# Altium footprint library Electronic Devices_LIB.PcbLib: 410 footprints (part 17 of 26)
Each footprint in its own frame and in the unit in brackets; x right, y up, seen from the top. Pads: shape width x height; smd on the part's side, far side on the other; paste and mask are expansions set on the pad; w line width, h text height; cw(c..) or ccw(c..) is an arc to the next point about the centre after c.
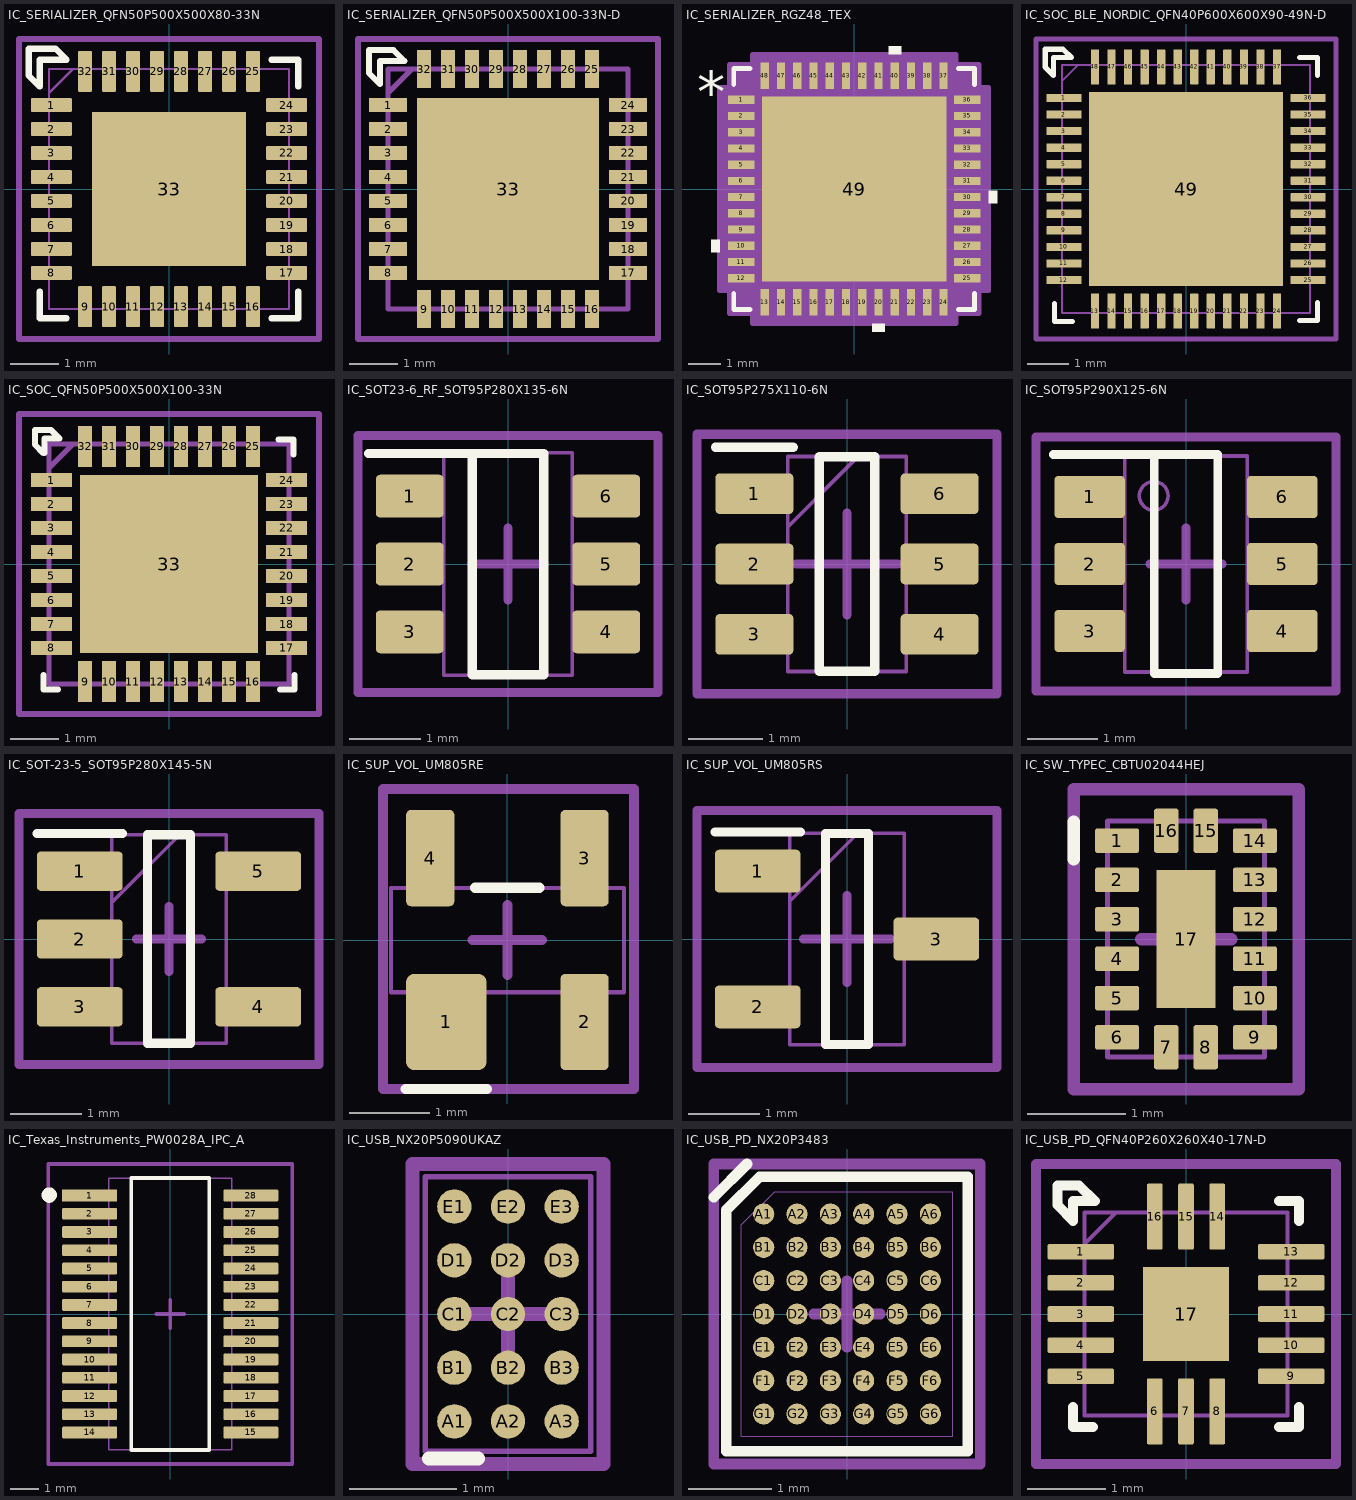
[diagram p16: the footprints below, top view; thin cyan lines are the x and y axes]

## IC_SERIALIZER_QFN50P500X500X80-33N [mm]
pads (33):
  rrect20% 0.85x0.3 smd paste+0 mask+0.076: 1(-2.45,1.75) 2(-2.45,1.25) 3(-2.45,0.75) 4(-2.45,0.25) 5(-2.45,-0.25) 6(-2.45,-0.75) 7(-2.45,-1.25) 8(-2.45,-1.75) 17(2.45,-1.75) 18(2.45,-1.25) 19(2.45,-0.75) 20(2.45,-0.25) 21(2.45,0.25) 22(2.45,0.75) 23(2.45,1.25) 24(2.45,1.75)
  rrect20% 0.3x0.85 smd paste+0 mask+0.076: 9(-1.75,-2.45) 10(-1.25,-2.45) 11(-0.75,-2.45) 12(-0.25,-2.45) 13(0.25,-2.45) 14(0.75,-2.45) 15(1.25,-2.45) 16(1.75,-2.45) 25(1.75,2.45) 26(1.25,2.45) 27(0.75,2.45) 28(0.25,2.45) 29(-0.25,2.45) 30(-0.75,2.45) 31(-1.25,2.45) 32(-1.75,2.45)
  rect 3.2x3.2 smd: 33(0,0)
Top Overlay:
  lines w0.127: -2.692,-2.134 -2.692,-2.692 -2.134,-2.692 ; 2.134,-2.692 2.692,-2.692 2.692,-2.134 ; 2.134,2.692 2.692,2.692 2.692,2.134 ; -2.921,2.362 -2.921,2.921 -2.362,2.921 -2.134,2.692 -2.692,2.692 -2.692,2.134 -2.921,2.362
Top Assembly:
  lines w0.051: -2.5,2 -2,2.5 ; -2.5,-2.5 -2.5,2.5 2.5,2.5 2.5,-2.5 -2.5,-2.5
  text ".Designator" at -2.438,-0.11 h0.51
Top Courtyard:
  lines w0.127: -0.787,0 0,0 ; 0,-0.787 0,0 ; 0,0.787 0,0 ; 0.787,0 0,0 ; -3.125,-3.125 -3.125,3.125 3.125,3.125 3.125,-3.125 -3.125,-3.125
3D body "DS90UB913ATRTVTQ1.stp": height 0.8, standoff 0, extent -2.55,-2.55 2.55,2.55

## IC_SERIALIZER_QFN50P500X500X100-33N-D [mm]
pads (33):
  rrect20% 0.8x0.3 smd: 1(-2.5,1.75) 2(-2.5,1.25) 3(-2.5,0.75) 4(-2.5,0.25) 5(-2.5,-0.25) 6(-2.5,-0.75) 7(-2.5,-1.25) 8(-2.5,-1.75) 17(2.5,-1.75) 18(2.5,-1.25) 19(2.5,-0.75) 20(2.5,-0.25) 21(2.5,0.25) 22(2.5,0.75) 23(2.5,1.25) 24(2.5,1.75)
  rrect20% 0.3x0.8 smd: 9(-1.75,-2.5) 10(-1.25,-2.5) 11(-0.75,-2.5) 12(-0.25,-2.5) 13(0.25,-2.5) 14(0.75,-2.5) 15(1.25,-2.5) 16(1.75,-2.5) 25(1.75,2.5) 26(1.25,2.5) 27(0.75,2.5) 28(0.25,2.5) 29(-0.25,2.5) 30(-0.75,2.5) 31(-1.25,2.5) 32(-1.75,2.5)
  rect 3.8x3.8 smd: 33(0,0)
Top Overlay:
  lines w0.127: -2.896,2.413 -2.896,2.896 -2.388,2.896 -2.159,2.667 -2.667,2.667 -2.667,2.184 -2.896,2.413
Top Assembly:
  text ".Designator" at -2.54,-0.161 h0.51
Top Courtyard:
  lines w0.127: -0.838,0 0,0 ; 0,-0.838 0,0 ; 0,0.838 0,0 ; 0.838,0 0,0 ; -3.125,-3.125 -3.125,3.125 3.125,3.125 3.125,-3.125 -3.125,-3.125
Top 3D Body:
  lines w0.1: -2.5,2 -2,2.5 ; -2.5,-2.5 -2.5,2.5 2.5,2.5 2.5,-2.5 -2.5,-2.5
3D body "DS90UB953ATRHBTQ1.stp": height 1, standoff 0, extent -2.5,-2.5 2.5,2.5

## IC_SERIALIZER_RGZ48_TEX [mil]
pads (49):
  rect 32x10 smd paste+0 mask+0: 1(-137,108.27) 2(-137,88.58) 3(-137,68.9) 4(-137,49.21) 5(-137,29.53) 6(-137,9.84) 7(-137,-9.84) 8(-137,-29.53) 9(-137,-49.21) 10(-137,-68.9) 11(-137,-88.58) 12(-137,-108.27) 25(137,-108.27) 26(137,-88.58) 27(137,-68.9) 28(137,-49.21) 29(137,-29.53) 30(137,-9.84) 31(137,9.84) 32(137,29.53) 33(137,49.21) 34(137,68.9) 35(137,88.58) 36(137,108.27)
  rect 10x32 smd paste+0 mask+0: 13(-108.27,-137) 14(-88.58,-137) 15(-68.9,-137) 16(-49.21,-137) 17(-29.53,-137) 18(-9.84,-137) 19(9.84,-137) 20(29.53,-137) 21(49.21,-137) 22(68.9,-137) 23(88.58,-137) 24(108.27,-137) 37(108.27,137) 38(88.58,137) 39(68.9,137) 40(49.21,137) 41(29.53,137) 42(9.84,137) 43(-9.84,137) 44(-29.53,137) 45(-49.21,137) 46(-68.9,137) 47(-88.58,137) 48(-108.27,137)
  rect 224x224 smd paste-111.5 mask-111.5: 49(0,0)
Top Overlay:
  region: 56.71,163 41.71,163 41.71,173 56.71,173
  region: 163,-2.34 173,-2.34 173,-17.34 163,-17.34
  region: 37.03,-163 22.03,-163 22.03,-173 37.03,-173
  region: -163,-61.4 -173,-61.4 -173,-76.4 -163,-76.4
  lines w6: -146,-126.37 -146,-146 -126.37,-146 ; -146,126.37 -146,146 -126.37,146 ; 126.37,-146 146,-146 146,-126.37 ; 126.37,146 146,146 146,126.37
  text "*" at -190.5,93.11 h50
Top Paste:
  drawing of 64 lines, arcs and shapes, not listed
Top Solder:
  region: 100.87,-114.5 100.87,114.5 114.5,114.5 114.5,-114.5
  region: 85.13,-114.5 85.13,114.5 69.87,114.5 69.87,-114.5
  region: 54.13,-114.5 54.13,114.5 38.87,114.5 38.87,-114.5
  region: 23.13,-114.5 23.13,114.5 7.87,114.5 7.87,-114.5
  region: -7.87,-114.5 -7.87,114.5 -23.13,114.5 -23.13,-114.5
  region: -38.87,-114.5 -38.87,114.5 -54.13,114.5 -54.13,-114.5
  region: -69.87,-114.5 -69.87,114.5 -85.13,114.5 -85.13,-114.5
  region: -114.5,-114.5 -114.5,114.5 -100.87,114.5 -100.87,-114.5
  region: -114.5,-114.5 -114.5,-100.87 114.5,-100.87 114.5,-114.5
  region: -114.5,-85.13 -114.5,-69.87 114.5,-69.87 114.5,-85.13
  region: -114.5,-54.13 -114.5,-38.87 114.5,-38.87 114.5,-54.13
  region: -114.5,-23.13 -114.5,-7.87 114.5,-7.87 114.5,-23.13
  region: -114.5,7.87 -114.5,23.13 114.5,23.13 114.5,7.87
  region: -114.5,38.87 -114.5,54.13 114.5,54.13 114.5,38.87
  region: -114.5,69.87 -114.5,85.13 114.5,85.13 114.5,69.87
  region: -114.5,100.87 -114.5,114.5 114.5,114.5 114.5,100.87
Top 3D Body:
  lines w1: -141,91 -91,141 ; -141,-141 -141,141 141,141 141,-141 -141,-141 ; -141,-114.27 -141,-102.27 -141,-114.27 ; -141,-94.58 -141,-82.58 -141,-94.58 ; -141,-74.9 -141,-62.9 -141,-74.9 ; -141,-55.21 -141,-43.21 -141,-55.21 ; -141,-35.53 -141,-23.53 -141,-35.53 ; -141,-15.84 -141,-3.84 -141,-15.84 ; -141,3.84 -141,15.84 -141,3.84 ; -141,23.53 -141,35.53 -141,23.53 ; -141,43.21 -141,55.21 -141,43.21 ; -141,62.9 -141,74.9 -141,62.9 ; -141,82.58 -141,94.58 -141,82.58 ; -141,102.27 -141,114.27 -141,102.27 ; -114.27,-141 -102.27,-141 -114.27,-141 ; -114.27,141 -102.27,141 -114.27,141 ; -94.58,-141 -82.58,-141 -94.58,-141 ; -94.58,141 -82.58,141 -94.58,141 ; -74.9,-141 -62.9,-141 -74.9,-141 ; -74.9,141 -62.9,141 -74.9,141 ; -55.21,-141 -43.21,-141 -55.21,-141 ; -55.21,141 -43.21,141 -55.21,141 ; -35.53,-141 -23.53,-141 -35.53,-141 ; -35.53,141 -23.53,141 -35.53,141 ; -15.84,-141 -3.84,-141 -15.84,-141 ; -15.84,141 -3.84,141 -15.84,141 ; 3.84,-141 15.84,-141 3.84,-141 ; 3.84,141 15.84,141 3.84,141 ; 23.53,-141 35.53,-141 23.53,-141 ; 23.53,141 35.53,141 23.53,141 ; 43.21,-141 55.21,-141 43.21,-141 ; 43.21,141 55.21,141 43.21,141 ; 62.9,-141 74.9,-141 62.9,-141 ; 62.9,141 74.9,141 62.9,141 ; 82.58,-141 94.58,-141 82.58,-141 ; 82.58,141 94.58,141 82.58,141 ; 102.27,-141 114.27,-141 102.27,-141 ; 102.27,141 114.27,141 102.27,141 ; 141,-114.27 141,-102.27 141,-114.27 ; 141,-94.58 141,-82.58 141,-94.58 ; 141,-74.9 141,-62.9 141,-74.9 ; 141,-55.21 141,-43.21 141,-55.21 ; 141,-35.53 141,-23.53 141,-35.53 ; 141,-15.84 141,-3.84 141,-15.84 ; 141,3.84 141,15.84 141,3.84 ; 141,23.53 141,35.53 141,23.53 ; 141,43.21 141,55.21 141,43.21 ; 141,62.9 141,74.9 141,62.9 ; 141,82.58 141,94.58 141,82.58 ; 141,102.27 141,114.27 141,102.27
  text "*" at -133.5,93.11 h50
Mechanical 15:
  region: -123.27,-151 -151,-151 -151,-123.27 -163,-123.27 -163,123.27 -151,123.27 -151,151 -123.27,151 -123.27,163 123.27,163 123.27,151 151,151 151,123.27 163,123.27 163,-123.27 151,-123.27 151,-151 123.27,-151 123.27,-163 -123.27,-163
  lines w6: -163,-123.27 -163,123.27 -151,123.27 -151,151 -123.27,151 -123.27,163 123.27,163 123.27,151 151,151 151,123.27 163,123.27 163,-123.27 151,-123.27 151,-151 123.27,-151 123.27,-163 -123.27,-163 -123.27,-151 -151,-151 -151,-123.27 -163,-123.27
3D body "RGZ48_TEX.step": height 39.09, standoff 0, extent -140.98,-140.98 140.98,140.98

## IC_SOC_BLE_NORDIC_QFN40P600X600X90-49N-D [mm] "48-VFQFN, EXPOSED PAD, PITCH 0.4mm"
height 0.9
pads (49):
  rrect20% 0.85x0.2 smd mask+0.076: 1(-2.95,2.2) 2(-2.95,1.8) 3(-2.95,1.4) 4(-2.95,1) 5(-2.95,0.6) 6(-2.95,0.2) 7(-2.95,-0.2) 8(-2.95,-0.6) 9(-2.95,-1) 10(-2.95,-1.4) 11(-2.95,-1.8) 12(-2.95,-2.2) 25(2.95,-2.2) 26(2.95,-1.8) 27(2.95,-1.4) 28(2.95,-1) 29(2.95,-0.6) 30(2.95,-0.2) 31(2.95,0.2) 32(2.95,0.6) 33(2.95,1) 34(2.95,1.4) 35(2.95,1.8) 36(2.95,2.2)
  rrect20% 0.2x0.85 smd mask+0.076: 13(-2.2,-2.95) 14(-1.8,-2.95) 15(-1.4,-2.95) 16(-1,-2.95) 17(-0.6,-2.95) 18(-0.2,-2.95) 19(0.2,-2.95) 20(0.6,-2.95) 21(1,-2.95) 22(1.4,-2.95) 23(1.8,-2.95) 24(2.2,-2.95) 37(2.2,2.95) 38(1.8,2.95) 39(1.4,2.95) 40(1,2.95) 41(0.6,2.95) 42(0.2,2.95) 43(-0.2,2.95) 44(-0.6,2.95) 45(-1,2.95) 46(-1.4,2.95) 47(-1.8,2.95) 48(-2.2,2.95)
  rect 4.7x4.7 smd mask+0.076: 49(0,0)
Top Overlay:
  lines w0.127: -3.175,-2.769 -3.175,-3.2 -2.743,-3.2 ; 2.743,-3.175 3.175,-3.175 3.175,-2.743 ; 2.743,3.175 3.175,3.175 3.175,2.743 ; -3.404,2.946 -3.404,3.378 -2.972,3.378 -2.769,3.175 -3.2,3.175 -3.2,2.743 -3.404,2.946
Top Assembly:
  lines w0.051: -3,2.6 -2.6,3 ; -3,-3 -3,3 3,3 3,-3 -3,-3
  text ".Designator" at -2.565,-0.212 h0.51
Top Courtyard:
  lines w0.127: -0.787,0 0,0 ; 0,-0.787 0,0 ; 0,0.787 0,0 ; 0.787,0 0,0 ; -3.625,-3.625 3.625,-3.625 3.625,3.625 -3.625,3.625 -3.625,-3.625
3D body "NRF52832-QFAA-R--3DModel-STEP-56544.STEP": height 0.91, standoff 0.01, extent -3,-3 3,3

## IC_SOC_QFN50P500X500X100-33N [mm] "QFN-32, 5 x 5 x 1 pitch 0.5 mm)"
height 1
pads (33):
  rrect2% 0.85x0.3 smd mask+0.076: 1(-2.45,1.75) 2(-2.45,1.25) 3(-2.45,0.75) 4(-2.45,0.25) 5(-2.45,-0.25) 6(-2.45,-0.75) 7(-2.45,-1.25) 8(-2.45,-1.75) 17(2.45,-1.75) 18(2.45,-1.25) 19(2.45,-0.75) 20(2.45,-0.25) 21(2.45,0.25) 22(2.45,0.75) 23(2.45,1.25) 24(2.45,1.75)
  rrect2% 0.3x0.85 smd mask+0.076: 9(-1.75,-2.45) 10(-1.25,-2.45) 11(-0.75,-2.45) 12(-0.25,-2.45) 13(0.25,-2.45) 14(0.75,-2.45) 15(1.25,-2.45) 16(1.75,-2.45) 25(1.75,2.45) 26(1.25,2.45) 27(0.75,2.45) 28(0.25,2.45) 29(-0.25,2.45) 30(-0.75,2.45) 31(-1.25,2.45) 32(-1.75,2.45)
  rect 3.7x3.7 smd mask+0.076: 33(0,0)
Top Overlay:
  lines w0.127: -2.616,-2.311 -2.616,-2.616 -2.311,-2.616 ; 2.286,2.591 2.591,2.591 2.591,2.286 ; 2.311,-2.616 2.616,-2.616 2.616,-2.311 ; -2.794,2.489 -2.794,2.794 -2.489,2.794 -2.464,2.794 -2.286,2.616 -2.591,2.616 -2.591,2.311 -2.616,2.311 -2.794,2.489
Top Assembly:
  text ".Designator" at -2.616,-0.212 h0.51
Top Courtyard:
  lines w0.127: -0.762,0 0,0 ; 0,-0.762 0,0 ; 0,0.762 0,0 ; 0.762,0 0,0 ; -3.125,-3.125 -3.125,3.125 3.125,3.125 3.125,-3.125 -3.125,-3.125
Top 3D Body:
  lines w0.1: -2.5,2 -2,2.5 ; -2.5,-2.5 -2.5,2.5 2.5,2.5 2.5,-2.5 -2.5,-2.5
3D body "BLUENRG-132.stp": height 1, standoff 0, extent -2.55,-2.55 2.55,2.55

## IC_SOT23-6_RF_SOT95P280X135-6N [mm] "SOT23, 6-Leads, Body 2.92x2.80mm, Pitch 0.95mm, IPC Medium Density"
height 1.35
pads (6):
  rrect20% 0.95x0.6 smd: 1(-1.375,0.95) 2(-1.375,0) 3(-1.375,-0.95) 4(1.375,-0.95) 5(1.375,0) 6(1.375,0.95)
Top Overlay:
  lines w0.127: -1.955,1.55 -0.5,1.55 ; -0.5,1.55 0.5,1.55 0.5,-1.55 -0.5,-1.55 -0.5,1.55
Top Assembly:
  lines w0.051: -0.9,-1.56 -0.9,1.56 0.9,1.56 0.9,-1.56 -0.9,-1.56
  text ".Designator" at -2.515,-0.136 h0.51
Top Courtyard:
  lines w0.127: -0.5,0 0.5,0 ; 0,-0.5 0,0.5 ; -2.1,-1.8 -2.1,1.8 2.1,1.8 2.1,-1.8 -2.1,-1.8
3D body "IC_SOT23-6_RF_SOT95P280X135-6N.step": height 1.35, standoff 0, extent -1.5,-1.56 1.5,1.56

## IC_SOT95P275X110-6N [mm]
pads (6):
  rrect20% 1.05x0.55 smd: 1(-1.25,0.95) 2(-1.25,0) 3(-1.25,-0.95) 4(1.25,-0.95) 5(1.25,0) 6(1.25,0.95)
Top Overlay:
  lines w0.127: -1.775,1.575 -0.725,1.575 ; -0.375,-1.45 0.375,-1.45 0.375,1.45 -0.375,1.45 -0.375,-1.45
Top Assembly:
  lines w0.051: -0.8,0.5 0.15,1.45 ; -0.8,-1.45 0.8,-1.45 0.8,1.45 -0.8,1.45 -0.8,-1.45
  text ".Designator" at -2.54,-0.034 h0.51
Top Courtyard:
  lines w0.127: -0.686,0 0,0 ; 0,-0.686 0,0 ; 0,0.686 0,0 ; 0.686,0 0,0 ; -2.025,-1.75 2.025,-1.75 2.025,1.75 -2.025,1.75 -2.025,-1.75
3D body "MAX16054AZT+T.stp": height 1.1, standoff 0, extent -1.375,-1.45 1.375,1.45

## IC_SOT95P290X125-6N [mm] "SOT23, 6-Leads, Body 2.94x2.90mm, Pitch 0.95mm, IPC Medium Density"
height 1.25
pads (6):
  rrect20% 1x0.6 smd: 1(-1.365,0.95) 2(-1.365,0) 3(-1.365,-0.95) 4(1.365,-0.95) 5(1.365,0) 6(1.365,0.95)
Top Overlay:
  lines w0.127: -1.88,1.549 -1.879,1.55 ; -1.879,1.55 -0.45,1.55 ; -0.45,1.55 -0.45,-1.55 0.45,-1.55 0.45,1.55 -0.45,1.55
Top Assembly:
  circle w0.051: c-0.457,0.965 r0.203
  lines w0.051: -0.865,-1.53 -0.865,1.53 0.865,1.53 0.865,-1.53 -0.865,-1.53
  text ".Designator" at -2.616,-0.161 h0.51
Top Courtyard:
  lines w0.127: -0.508,0 0,0 ; 0,-0.508 0,0 ; 0,0.508 0,0 ; 0.508,0 0,0 ; -2.125,-1.8 2.125,-1.8 2.125,1.8 -2.125,1.8 -2.125,-1.8
3D body "SOT95P290X125-6N.step": height 1.25, standoff 0, extent -1.5,-1.53 1.5,1.53

## IC_SOT-23-5_SOT95P280X145-5N [mm] "SC-74A, SOT-753"
height 1.45
pads (5):
  rrect20% 1.2x0.55 smd: 1(-1.25,0.95) 2(-1.25,0) 3(-1.25,-0.95) 4(1.25,-0.95) 5(1.25,0.95)
Top Overlay:
  lines w0.127: -1.85,1.475 -0.65,1.475 ; -0.3,-1.46 0.3,-1.46 0.3,1.46 -0.3,1.46 -0.3,-1.46
Top Assembly:
  lines w0.051: -0.8,0.51 0.15,1.46 ; -0.8,-1.46 0.8,-1.46 0.8,1.46 -0.8,1.46 -0.8,-1.46
  text ".Designator" at -2.565,-0.212 h0.51
Top Courtyard:
  lines w0.127: -0.457,0 0,0 ; 0,-0.457 0,0 ; 0,0.457 0,0 ; 0.457,0 0,0 ; -2.1,-1.76 2.1,-1.76 2.1,1.76 -2.1,1.76 -2.1,-1.76
3D body "AP2202K-3.3TRG1.stp": height 1.45, standoff 0, extent -1.4,-1.46 1.4,1.46

## IC_SUP_VOL_UM805RE [mm] "SOT-143"
height 1.22
pads (4):
  rrect20% 1x1.2 smd: 1(-0.76,-1.02)
  rrect20% 0.6x1.2 smd: 2(0.96,-1.02) 3(0.96,1.02) 4(-0.96,1.02)
Top Overlay:
  lines w0.127: -1.27,-1.854 -0.254,-1.854 ; -0.4,0.65 0.4,0.65
Top Assembly:
  text ".Designator" at -2.399,-0.095 h0.51
Top Courtyard:
  lines w0.127: -0.432,0 0,0 ; 0,-0.432 0,0 ; 0,0.432 0,0 ; 0.432,0 0,0 ; -1.549,-1.854 1.575,-1.854 1.575,1.88 -1.549,1.88 -1.549,-1.854
Top 3D Body:
  lines w0.051: -1.45,-0.65 1.45,-0.65 1.45,0.65 -1.45,0.65 -1.45,-0.65
3D body "UM805RE.stp": height 1.32, standoff 0, extent -1.45,-0.65 1.45,0.65

## IC_SUP_VOL_UM805RS [mm] "SOT-23-3"
height 1.1
pads (3):
  rrect20% 1.2x0.6 smd: 1(-1.25,0.95) 2(-1.25,-0.95) 3(1.25,0)
Top Overlay:
  lines w0.127: -1.85,1.5 -0.65,1.5 ; -0.3,-1.48 0.3,-1.48 0.3,1.48 -0.3,1.48 -0.3,-1.48
Top Assembly:
  lines w0.051: -0.8,0.53 0.15,1.48 ; -0.8,-1.48 0.8,-1.48 0.8,1.48 -0.8,1.48 -0.8,-1.48
  text ".Designator" at -2.794,-0.237 h0.51
Top Courtyard:
  lines w0.127: -0.61,0 0,0 ; 0,-0.61 0,0 ; 0,0.61 0,0 ; 0.61,0 0,0 ; -2.1,-1.8 2.1,-1.8 2.1,1.8 -2.1,1.8 -2.1,-1.8
3D body "UM803RS.stp": height 1.4, standoff 0, extent -1.4,-1.48 1.4,1.48

## IC_SW_TYPEC_CBTU02044HEJ [mm]
pads (17):
  rrect20% 0.45x0.25 smd: 1(-0.7,1) 2(-0.7,0.6) 3(-0.7,0.2) 4(-0.7,-0.2) 5(-0.7,-0.6) 6(-0.7,-1) 9(0.7,-1) 10(0.7,-0.6) 11(0.7,-0.2) 12(0.7,0.2) 13(0.7,0.6) 14(0.7,1)
  rrect20% 0.25x0.45 smd: 7(-0.2,-1.1) 8(0.2,-1.1) 15(0.2,1.1) 16(-0.2,1.1)
  rect 0.6x1.4 smd: 17(0,0)
Top Overlay:
  lines w0.127: -1.143,0.813 -1.143,1.194
Top Assembly:
  lines w0.051: -0.8,-1.2 0.8,-1.2 0.8,1.2 -0.8,1.2 -0.8,-1.2
  text ".Designator" at -2.464,-0.136 h0.51
Top Courtyard:
  lines w0.127: -0.457,0 0,0 ; 0,-0.457 0,0 ; 0,0.457 0,0 ; 0.457,0 0,0 ; -1.143,-1.524 1.143,-1.524 1.143,1.524 -1.143,1.524 -1.143,-1.524
3D body "CBTU02043HEJ.stp": height 0.65, standoff 0, extent -0.8,-1.2 0.8,1.2

## IC_Texas_Instruments_PW0028A_IPC_A [mm]
pads (28):
  rect 1.955x0.421 smd: 1(-2.875,4.225)
  rrect20% 1.955x0.421 smd: 2(-2.875,3.575) 3(-2.875,2.925) 4(-2.875,2.275) 5(-2.875,1.625) 6(-2.875,0.975) 7(-2.875,0.325) 8(-2.875,-0.325) 9(-2.875,-0.975) 10(-2.875,-1.625) 11(-2.875,-2.275) 12(-2.875,-2.925) 13(-2.875,-3.575) 14(-2.875,-4.225) 15(2.875,-4.225) 16(2.875,-3.575) 17(2.875,-2.925) 18(2.875,-2.275) 19(2.875,-1.625) 20(2.875,-0.975) 21(2.875,-0.325) 22(2.875,0.325) 23(2.875,0.975) 24(2.875,1.625) 25(2.875,2.275) 26(2.875,2.925) 27(2.875,3.575) 28(2.875,4.225)
Top Overlay:
  circle w0.3: c-4.318,4.242 r0.125
  lines w0.127: -1.398,-4.85 1.398,-4.85 1.398,4.85 -1.398,4.85 -1.398,-4.85
Top Assembly:
  lines w0.051: -2.2,-4.85 2.2,-4.85 2.2,4.85 -2.2,4.85 -2.2,-4.85
  text ".Designator" at -2.388,-0.034 h0.51
Top Courtyard:
  lines w0.127: -0.5,0 0.5,0 ; 0,-0.5 0,0.5 ; -4.353,-5.35 4.353,-5.35 4.353,5.35 -4.353,5.35 -4.353,-5.35
3D body "IC_Texas_Instruments_PGA450TPWRQ1_eec.STEP": height 0.25, standoff 0, extent -4.353,-5.35 4.353,5.35

## IC_USB_NX20P5090UKAZ [mm]
pads (15):
  round 0.32 smd: A1(-0.5,-1) A2(0,-1) A3(0.5,-1) B1(-0.5,-0.5) B2(0,-0.5) B3(0.5,-0.5) C1(-0.5,0) C2(0,0) C3(0.5,0) D1(-0.5,0.5) D2(0,0.5) D3(0.5,0.5) E1(-0.5,1) E2(0,1) E3(0.5,1)
Top Overlay:
  lines w0.127: -0.737,-1.346 -0.279,-1.346
Top Assembly:
  lines w0.051: -0.77,-1.28 0.77,-1.28 0.77,1.28 -0.77,1.28 -0.77,-1.28
  text ".Designator" at -2.642,-0.161 h0.51
Top Courtyard:
  lines w0.127: -0.508,0 0,0 ; 0,-0.508 0,0 ; 0,0.508 0,0 ; 0.508,0 0,0 ; -0.889,-1.397 0.889,-1.397 0.889,1.397 -0.889,1.397 -0.889,-1.397
3D body "NX20P5090UKAZ.stp": height 0.69, standoff 0, extent -0.77,-1.28 0.77,1.28

## IC_USB_PD_NX20P3483 [mil] "WLCSP42_0P4_2P94X2P54_SMDP"
pads (42):
  round 10 smd: A1(-39.37,47.24) A2(-23.62,47.24) A3(-7.87,47.24) A4(7.87,47.24) A5(23.62,47.24) A6(39.37,47.24) B1(-39.37,31.5) B2(-23.62,31.5) B3(-7.87,31.5) B4(7.87,31.5) B5(23.62,31.5) B6(39.37,31.5) C1(-39.37,15.75) C2(-23.62,15.75) C3(-7.87,15.75) C4(7.87,15.75) C5(23.62,15.75) C6(39.37,15.75) D1(-39.37,0) D2(-23.62,0) D3(-7.87,0) D4(7.87,0) D5(23.62,0) D6(39.37,0) E1(-39.37,-15.75) E2(-23.62,-15.75) E3(-7.87,-15.75) E4(7.87,-15.75) E5(23.62,-15.75) E6(39.37,-15.75) F1(-39.37,-31.5) F2(-23.62,-31.5) F3(-7.87,-31.5) F4(7.87,-31.5) F5(23.62,-31.5) F6(39.37,-31.5) G1(-39.37,-47.24) G2(-23.62,-47.24) G3(-7.87,-47.24) G4(7.87,-47.24) G5(23.62,-47.24) G6(39.37,-47.24)
Top Overlay:
  lines w5: -62.99,55.12 -47.24,70.86 ; -57,-64.87 -57,49.13 -41.25,64.87 57,64.87 57,-64.87 -57,-64.87
Top Assembly:
  lines w0.01: -50,-57.87 -50,42.13 -34.25,57.87 50,57.87 50,-57.87 -50,-57.87
  text ".Designator" at -92.49,-11.02 h20
Top Courtyard:
  lines w5: -15.75,0 0,0 ; 0,-15.75 0,0 ; 0,15.75 0,0 ; 15.75,0 0,0 ; -62.99,-70.87 62.99,-70.87 62.99,70.87 -62.99,70.87 -62.99,-70.87
3D body "NX20P3483UKAZ.stp": height 22.24, standoff 0, extent -49.41,-57.28 49.41,57.28

## IC_USB_PD_QFN40P260X260X40-17N-D [mm] "QFN"
pads (17):
  rrect20% 0.85x0.2 smd: 1(-1.35,0.8) 2(-1.35,0.4) 3(-1.35,0) 4(-1.35,-0.4) 5(-1.35,-0.8) 9(1.35,-0.8) 10(1.35,-0.4) 11(1.35,0) 12(1.35,0.4) 13(1.35,0.8)
  rrect20% 0.2x0.85 smd: 6(-0.4,-1.25) 7(0,-1.25) 8(0.4,-1.25) 14(0.4,1.25) 15(0,1.25) 16(-0.4,1.25)
  rect 1.1x1.2 smd: 17(0,0)
Top Overlay:
  lines w0.127: -1.448,-1.194 -1.448,-1.448 -1.194,-1.448 ; -1.194,1.448 -1.168,1.448 ; 1.194,-1.448 1.448,-1.448 1.448,-1.194 ; 1.194,1.448 1.448,1.448 1.448,1.194 ; -1.168,1.448 -1.372,1.651 -1.651,1.651 -1.651,1.397 -1.448,1.194 -1.448,1.448 -1.168,1.448
Top Assembly:
  lines w0.051: -1.3,0.9 -0.9,1.3 ; -1.3,-1.3 1.3,-1.3 1.3,1.3 -1.3,1.3 -1.3,-1.3
  text ".Designator" at -2.794,-0.186 h0.51
Top Courtyard:
  lines w0.127: -0.432,0 0,0 ; 0,-0.432 0,0 ; 0,0.432 0,0 ; 0.432,0 0,0 ; -1.925,-1.925 1.925,-1.925 1.925,1.925 -1.925,1.925 -1.925,-1.925
3D body "PTN5110NHQZ.stp": height 0.4, standoff 0, extent -1.35,-1.35 1.35,1.35